# Altium footprint library Library.PcbLib: 225 footprints (part 13 of 16)
Each footprint in its own frame and in the unit in brackets; x right, y up, seen from the top. Pads: shape width x height; smd on the part's side, far side on the other; paste and mask are expansions set on the pad; w line width, h text height; cw(c..) or ccw(c..) is an arc to the next point about the centre after c.
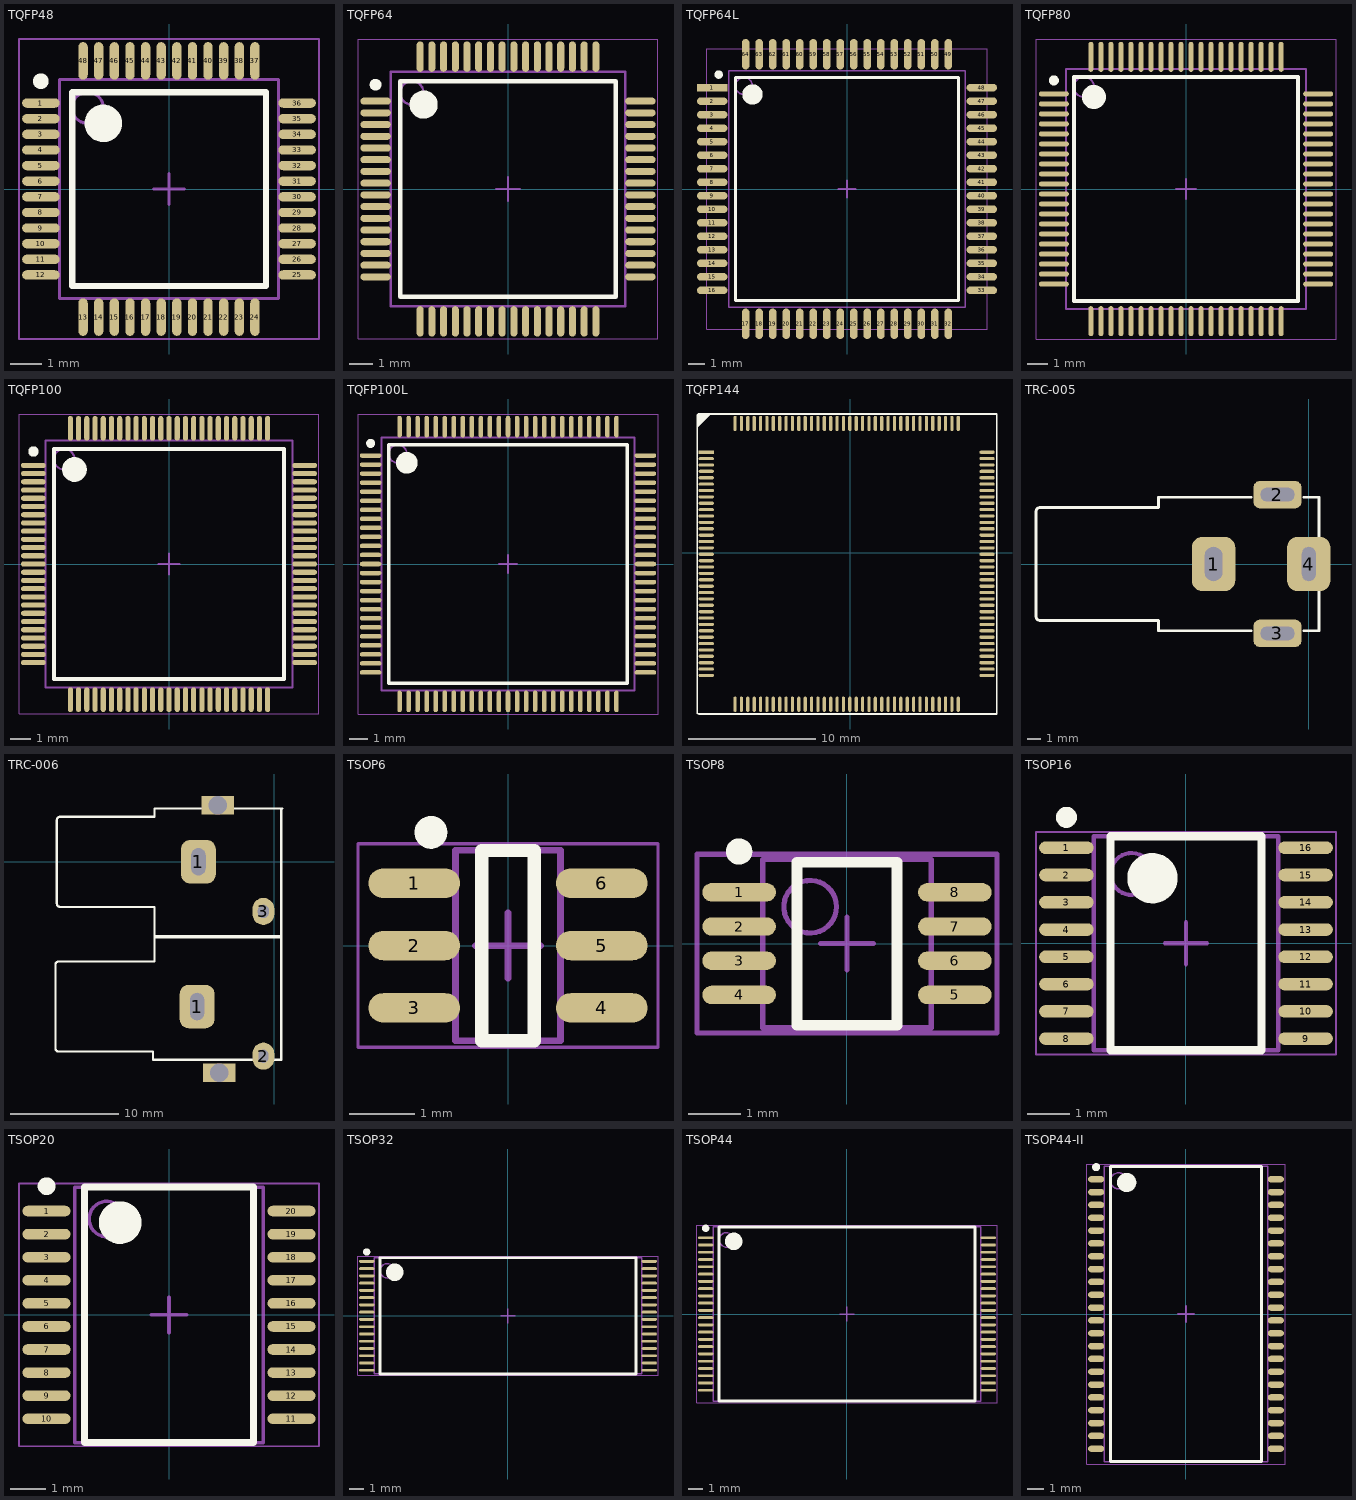
[diagram p12: the footprints below, top view; thin cyan lines are the x and y axes]

## TQFP48 [mm] "TQFP, 48-Leads, Body 7.00x7.00mm, Pitch 0.50mm, IPC High Density"
height 1.6
pads (48):
  oval 1.2x0.3 smd: 1(-4.1,2.75) 2(-4.1,2.25) 3(-4.1,1.75) 4(-4.1,1.25) 5(-4.1,0.75) 6(-4.1,0.25) 7(-4.1,-0.25) 8(-4.1,-0.75) 9(-4.1,-1.25) 10(-4.1,-1.75) 11(-4.1,-2.25) 12(-4.1,-2.75) 25(4.1,-2.75) 26(4.1,-2.25) 27(4.1,-1.75) 28(4.1,-1.25) 29(4.1,-0.75) 30(4.1,-0.25) 31(4.1,0.25) 32(4.1,0.75) 33(4.1,1.25) 34(4.1,1.75) 35(4.1,2.25) 36(4.1,2.75)
  oval 0.3x1.2 smd: 13(-2.75,-4.1) 14(-2.25,-4.1) 15(-1.75,-4.1) 16(-1.25,-4.1) 17(-0.75,-4.1) 18(-0.25,-4.1) 19(0.25,-4.1) 20(0.75,-4.1) 21(1.25,-4.1) 22(1.75,-4.1) 23(2.25,-4.1) 24(2.75,-4.1) 37(2.75,4.1) 38(2.25,4.1) 39(1.75,4.1) 40(1.25,4.1) 41(0.75,4.1) 42(0.25,4.1) 43(-0.25,4.1) 44(-0.75,4.1) 45(-1.25,4.1) 46(-1.75,4.1) 47(-2.25,4.1) 48(-2.75,4.1)
Top Overlay:
  circle w0.6: c-2.1,2.1 r0.3
  circle w0.25: c-4.1,3.45 r0.125
  lines w0.2: -3.1,-3.1 3.1,-3.1 3.1,3.1 -3.1,3.1 -3.1,-3.1
Mechanical 13:
  circle w0.1: c-2.6,2.6 r0.5
  lines w0.1: -3.5,-3.5 3.5,-3.5 3.5,3.5 -3.5,3.5 -3.5,-3.5
Mechanical 15:
  lines w0.05: -4.8,-4.8 4.8,-4.8 4.8,4.8 -4.8,4.8 -4.8,-4.8
  lines w0.1: -0.5,0 0.5,0 ; 0,-0.5 0,0.5
3D body "User Library-TQFP-48.STEP": height 1.45, standoff -0.01, extent -4.5,-4.5 4.5,4.5

## TQFP64 [mm] "TQFP, 64-Leads, Body 10.00x10.00mm, Pitch 0.50mm, IPC High Density"
height 1.3
pads (64):
  oval 1.3x0.3 smd: 1(-5.65,3.75) 2(-5.65,3.25) 3(-5.65,2.75) 4(-5.65,2.25) 5(-5.65,1.75) 6(-5.65,1.25) 7(-5.65,0.75) 8(-5.65,0.25) 9(-5.65,-0.25) 10(-5.65,-0.75) 11(-5.65,-1.25) 12(-5.65,-1.75) 13(-5.65,-2.25) 14(-5.65,-2.75) 15(-5.65,-3.25) 16(-5.65,-3.75) 33(5.65,-3.75) 34(5.65,-3.25) 35(5.65,-2.75) 36(5.65,-2.25) 37(5.65,-1.75) 38(5.65,-1.25) 39(5.65,-0.75) 40(5.65,-0.25) 41(5.65,0.25) 42(5.65,0.75) 43(5.65,1.25) 44(5.65,1.75) 45(5.65,2.25) 46(5.65,2.75) 47(5.65,3.25) 48(5.65,3.75)
  oval 0.3x1.3 smd: 17(-3.75,-5.65) 18(-3.25,-5.65) 19(-2.75,-5.65) 20(-2.25,-5.65) 21(-1.75,-5.65) 22(-1.25,-5.65) 23(-0.75,-5.65) 24(-0.25,-5.65) 25(0.25,-5.65) 26(0.75,-5.65) 27(1.25,-5.65) 28(1.75,-5.65) 29(2.25,-5.65) 30(2.75,-5.65) 31(3.25,-5.65) 32(3.75,-5.65) 49(3.75,5.65) 50(3.25,5.65) 51(2.75,5.65) 52(2.25,5.65) 53(1.75,5.65) 54(1.25,5.65) 55(0.75,5.65) 56(0.25,5.65) 57(-0.25,5.65) 58(-0.75,5.65) 59(-1.25,5.65) 60(-1.75,5.65) 61(-2.25,5.65) 62(-2.75,5.65) 63(-3.25,5.65) 64(-3.75,5.65)
Top Overlay:
  circle w0.25: c-5.65,4.45 r0.125
  circle w0.6: c-3.6,3.6 r0.3
  lines w0.2: -4.6,-4.6 -4.6,4.6 4.6,4.6 4.6,-4.6 -4.6,-4.6
Mechanical 13:
  circle w0.1: c-4.1,4.1 r0.5
  lines w0.1: -5,-5 -5,5 5,5 5,-5 -5,-5
Mechanical 15:
  lines w0.05: -6.4,-6.4 -6.4,6.4 6.4,6.4 6.4,-6.4 -6.4,-6.4
  lines w0.1: -0.5,0 0.5,0 ; 0,-0.5 0,0.5
3D body "User Library-S-PQFP-G64.step": height 1, standoff 0, extent -5.787,-5.79 5.787,5.791

## TQFP64L [mm] "TQFP, 64-Leads, Body 14.00x14.00mm, Pitch 0.80mm, IPC High Density"
height 1.4
pads (64):
  rect 1.8x0.45 smd: 1(-7.981,6)
  oval 1.8x0.45 smd: 2(-7.981,5.2) 3(-7.981,4.4) 4(-7.981,3.6) 5(-7.981,2.8) 6(-7.981,2) 7(-7.981,1.2) 8(-7.981,0.4) 9(-7.981,-0.4) 10(-7.981,-1.2) 11(-7.981,-2) 12(-7.981,-2.8) 13(-7.981,-3.6) 14(-7.981,-4.4) 15(-7.981,-5.2) 16(-7.981,-6) 33(7.981,-6) 34(7.981,-5.2) 35(7.981,-4.4) 36(7.981,-3.6) 37(7.981,-2.8) 38(7.981,-2) 39(7.981,-1.2) 40(7.981,-0.4) 41(7.981,0.4) 42(7.981,1.2) 43(7.981,2) 44(7.981,2.8) 45(7.981,3.6) 46(7.981,4.4) 47(7.981,5.2) 48(7.981,6)
  oval 0.45x1.8 smd: 17(-6,-7.981) 18(-5.2,-7.981) 19(-4.4,-7.981) 20(-3.6,-7.981) 21(-2.8,-7.981) 22(-2,-7.981) 23(-1.2,-7.981) 24(-0.4,-7.981) 25(0.4,-7.981) 26(1.2,-7.981) 27(2,-7.981) 28(2.8,-7.981) 29(3.6,-7.981) 30(4.4,-7.981) 31(5.2,-7.981) 32(6,-7.981) 49(6,7.981) 50(5.2,7.981) 51(4.4,7.981) 52(3.6,7.981) 53(2.8,7.981) 54(2,7.981) 55(1.2,7.981) 56(0.4,7.981) 57(-0.4,7.981) 58(-1.2,7.981) 59(-2,7.981) 60(-2.8,7.981) 61(-3.6,7.981) 62(-4.4,7.981) 63(-5.2,7.981) 64(-6,7.981)
Top Overlay:
  circle w0.6: c-5.6,5.6 r0.3
  circle w0.25: c-7.6,6.775 r0.125
  lines w0.2: -6.604,-6.604 6.596,-6.604 ; -6.6,-6.6 -6.6,6.6 6.6,6.6 6.6,-6.6
Mechanical 13:
  circle w0.1: c-6.1,6.1 r0.5
  lines w0.1: -7,-7 7,-7 7,7 -7,7 -7,-7
Mechanical 15:
  lines w0.05: -8.3,-8.3 8.3,-8.3 8.3,8.3 -8.3,8.3 -8.3,-8.3
  lines w0.1: -0.5,0 0.5,0 ; 0,-0.5 0,0.5
3D body "User Library-atmega64 (tqfp64).step": height 1.1, standoff -0.01, extent -7.968,-7.968 8.032,8.032

## TQFP80 [mm] "TQFP, 80-Leads, Body 12.00x12.00mm, Pitch 0.50mm, IPC High Density"
height 1
pads (80):
  oval 1.5x0.25 smd: 1(-6.6,4.75) 2(-6.6,4.25) 3(-6.6,3.75) 4(-6.6,3.25) 5(-6.6,2.75) 6(-6.6,2.25) 7(-6.6,1.75) 8(-6.6,1.25) 9(-6.6,0.75) 10(-6.6,0.25) 11(-6.6,-0.25) 12(-6.6,-0.75) 13(-6.6,-1.25) 14(-6.6,-1.75) 15(-6.6,-2.25) 16(-6.6,-2.75) 17(-6.6,-3.25) 18(-6.6,-3.75) 19(-6.6,-4.25) 20(-6.6,-4.75) 41(6.6,-4.75) 42(6.6,-4.25) 43(6.6,-3.75) 44(6.6,-3.25) 45(6.6,-2.75) 46(6.6,-2.25) 47(6.6,-1.75) 48(6.6,-1.25) 49(6.6,-0.75) 50(6.6,-0.25) 51(6.6,0.25) 52(6.6,0.75) 53(6.6,1.25) 54(6.6,1.75) 55(6.6,2.25) 56(6.6,2.75) 57(6.6,3.25) 58(6.6,3.75) 59(6.6,4.25) 60(6.6,4.75)
  oval 0.25x1.5 smd: 21(-4.75,-6.6) 22(-4.25,-6.6) 23(-3.75,-6.6) 24(-3.25,-6.6) 25(-2.75,-6.6) 26(-2.25,-6.6) 27(-1.75,-6.6) 28(-1.25,-6.6) 29(-0.75,-6.6) 30(-0.25,-6.6) 31(0.25,-6.6) 32(0.75,-6.6) 33(1.25,-6.6) 34(1.75,-6.6) 35(2.25,-6.6) 36(2.75,-6.6) 37(3.25,-6.6) 38(3.75,-6.6) 39(4.25,-6.6) 40(4.75,-6.6) 61(4.75,6.6) 62(4.25,6.6) 63(3.75,6.6) 64(3.25,6.6) 65(2.75,6.6) 66(2.25,6.6) 67(1.75,6.6) 68(1.25,6.6) 69(0.75,6.6) 70(0.25,6.6) 71(-0.25,6.6) 72(-0.75,6.6) 73(-1.25,6.6) 74(-1.75,6.6) 75(-2.25,6.6) 76(-2.75,6.6) 77(-3.25,6.6) 78(-3.75,6.6) 79(-4.25,6.6) 80(-4.75,6.6)
Top Overlay:
  circle w0.6: c-4.6,4.6 r0.3
  circle w0.25: c-6.6,5.425 r0.125
  lines w0.2: -5.6,-5.6 5.6,-5.6 5.6,5.6 -5.6,5.6 -5.6,-5.6
Mechanical 13:
  circle w0.1: c-5.1,5.1 r0.5
  lines w0.1: -6,-6 6,-6 6,6 -6,6 -6,-6
Mechanical 15:
  lines w0.05: -7.493,-7.493 7.493,-7.493 7.493,7.493 -7.493,7.493 -7.493,-7.493
  lines w0.1: -0.5,0 0.5,0 ; 0,-0.5 0,0.5
3D body "User Library-TQFP-80.STEP": height 1.05, standoff -0.01, extent -7,-7 7,7

## TQFP100 [mm] "TQFP, 100-Leads, Body 12.00x12.00mm, Pitch 0.40mm, IPC High Density"
height 1
pads (100):
  oval 1.2x0.25 smd: 1(-6.6,4.8) 2(-6.6,4.4) 3(-6.6,4) 4(-6.6,3.6) 5(-6.6,3.2) 6(-6.6,2.8) 7(-6.6,2.4) 8(-6.6,2) 9(-6.6,1.6) 10(-6.6,1.2) 11(-6.6,0.8) 12(-6.6,0.4) 13(-6.6,0) 14(-6.6,-0.4) 15(-6.6,-0.8) 16(-6.6,-1.2) 17(-6.6,-1.6) 18(-6.6,-2) 19(-6.6,-2.4) 20(-6.6,-2.8) 21(-6.6,-3.2) 22(-6.6,-3.6) 23(-6.6,-4) 24(-6.6,-4.4) 25(-6.6,-4.8) 51(6.6,-4.8) 52(6.6,-4.4) 53(6.6,-4) 54(6.6,-3.6) 55(6.6,-3.2) 56(6.6,-2.8) 57(6.6,-2.4) 58(6.6,-2) 59(6.6,-1.6) 60(6.6,-1.2) 61(6.6,-0.8) 62(6.6,-0.4) 63(6.6,0) 64(6.6,0.4) 65(6.6,0.8) 66(6.6,1.2) 67(6.6,1.6) 68(6.6,2) 69(6.6,2.4) 70(6.6,2.8) 71(6.6,3.2) 72(6.6,3.6) 73(6.6,4) 74(6.6,4.4) 75(6.6,4.8)
  oval 0.25x1.2 smd: 26(-4.8,-6.6) 27(-4.4,-6.6) 28(-4,-6.6) 29(-3.6,-6.6) 30(-3.2,-6.6) 31(-2.8,-6.6) 32(-2.4,-6.6) 33(-2,-6.6) 34(-1.6,-6.6) 35(-1.2,-6.6) 36(-0.8,-6.6) 37(-0.4,-6.6) 38(0,-6.6) 39(0.4,-6.6) 40(0.8,-6.6) 41(1.2,-6.6) 42(1.6,-6.6) 43(2,-6.6) 44(2.4,-6.6) 45(2.8,-6.6) 46(3.2,-6.6) 47(3.6,-6.6) 48(4,-6.6) 49(4.4,-6.6) 50(4.8,-6.6) 76(4.8,6.6) 77(4.4,6.6) 78(4,6.6) 79(3.6,6.6) 80(3.2,6.6) 81(2.8,6.6) 82(2.4,6.6) 83(2,6.6) 84(1.6,6.6) 85(1.2,6.6) 86(0.8,6.6) 87(0.4,6.6) 88(0,6.6) 89(-0.4,6.6) 90(-0.8,6.6) 91(-1.2,6.6) 92(-1.6,6.6) 93(-2,6.6) 94(-2.4,6.6) 95(-2.8,6.6) 96(-3.2,6.6) 97(-3.6,6.6) 98(-4,6.6) 99(-4.4,6.6) 100(-4.8,6.6)
Top Overlay:
  circle w0.25: c-6.6,5.475 r0.125
  circle w0.6: c-4.6,4.6 r0.3
  lines w0.2: -5.6,-5.6 -5.6,5.6 5.6,5.6 5.6,-5.6 -5.6,-5.6
Mechanical 13:
  circle w0.1: c-5.1,5.1 r0.5
  lines w0.1: -6,-6 -6,6 6,6 6,-6 -6,-6
Mechanical 15:
  lines w0.05: -7.3,-7.3 -7.3,7.3 7.3,7.3 7.3,-7.3 -7.3,-7.3
  lines w0.1: -0.5,0 0.5,0 ; 0,-0.5 0,0.5
3D body "User Library-TQFP100_0_4mm.step": height 1.2, standoff 0, extent -7,-6.985 7,7.015

## TQFP100L [mm] "TQFP, 100-Leads, Body 14.00x14.00mm, Pitch 0.50mm, IPC High Density"
height 2
pads (100):
  oval 1.2x0.25 smd: 1(-7.6,6) 2(-7.6,5.5) 3(-7.6,5) 4(-7.6,4.5) 5(-7.6,4) 6(-7.6,3.5) 7(-7.6,3) 8(-7.6,2.5) 9(-7.6,2) 10(-7.6,1.5) 11(-7.6,1) 12(-7.6,0.5) 13(-7.6,0) 14(-7.6,-0.5) 15(-7.6,-1) 16(-7.6,-1.5) 17(-7.6,-2) 18(-7.6,-2.5) 19(-7.6,-3) 20(-7.6,-3.5) 21(-7.6,-4) 22(-7.6,-4.5) 23(-7.6,-5) 24(-7.6,-5.5) 25(-7.6,-6) 51(7.6,-6) 52(7.6,-5.5) 53(7.6,-5) 54(7.6,-4.5) 55(7.6,-4) 56(7.6,-3.5) 57(7.6,-3) 58(7.6,-2.5) 59(7.6,-2) 60(7.6,-1.5) 61(7.6,-1) 62(7.6,-0.5) 63(7.6,0) 64(7.6,0.5) 65(7.6,1) 66(7.6,1.5) 67(7.6,2) 68(7.6,2.5) 69(7.6,3) 70(7.6,3.5) 71(7.6,4) 72(7.6,4.5) 73(7.6,5) 74(7.6,5.5) 75(7.6,6)
  oval 0.25x1.2 smd: 26(-6,-7.6) 27(-5.5,-7.6) 28(-5,-7.6) 29(-4.5,-7.6) 30(-4,-7.6) 31(-3.5,-7.6) 32(-3,-7.6) 33(-2.5,-7.6) 34(-2,-7.6) 35(-1.5,-7.6) 36(-1,-7.6) 37(-0.5,-7.6) 38(0,-7.6) 39(0.5,-7.6) 40(1,-7.6) 41(1.5,-7.6) 42(2,-7.6) 43(2.5,-7.6) 44(3,-7.6) 45(3.5,-7.6) 46(4,-7.6) 47(4.5,-7.6) 48(5,-7.6) 49(5.5,-7.6) 50(6,-7.6) 76(6,7.6) 77(5.5,7.6) 78(5,7.6) 79(4.5,7.6) 80(4,7.6) 81(3.5,7.6) 82(3,7.6) 83(2.5,7.6) 84(2,7.6) 85(1.5,7.6) 86(1,7.6) 87(0.5,7.6) 88(0,7.6) 89(-0.5,7.6) 90(-1,7.6) 91(-1.5,7.6) 92(-2,7.6) 93(-2.5,7.6) 94(-3,7.6) 95(-3.5,7.6) 96(-4,7.6) 97(-4.5,7.6) 98(-5,7.6) 99(-5.5,7.6) 100(-6,7.6)
Top Overlay:
  circle w0.25: c-7.6,6.675 r0.125
  circle w0.6: c-5.6,5.6 r0.3
  lines w0.2: -6.6,-6.6 -6.6,6.6 6.6,6.6 6.6,-6.6 -6.6,-6.6
Mechanical 13:
  circle w0.1: c-6.1,6.1 r0.5
  lines w0.1: -7,-7 -7,7 7,7 7,-7 -7,-7
Mechanical 15:
  lines w0.05: -8.3,-8.3 -8.3,8.3 8.3,8.3 8.3,-8.3 -8.3,-8.3
  lines w0.1: -0.5,0 0.5,0 ; 0,-0.5 0,0.5
3D body "User Library-TQFP100_Grid_0_5.STEP": height 1.2, standoff 0, extent -8,-8 8,8

## TQFP144 [mm]
pads (144):
  rect 1.2x0.254 smd: 1(-11.303,7.874)
  oval 1.2x0.254 smd: 2(-11.303,7.374) 3(-11.303,6.874) 4(-11.303,6.374) 5(-11.303,5.874) 6(-11.303,5.374) 7(-11.303,4.874) 8(-11.303,4.374) 9(-11.303,3.874) 10(-11.303,3.374) 11(-11.303,2.874) 12(-11.303,2.374) 13(-11.303,1.874) 14(-11.303,1.374) 15(-11.303,0.874) 16(-11.303,0.374) 17(-11.303,-0.126) 18(-11.303,-0.626) 19(-11.303,-1.126) 20(-11.303,-1.626) 21(-11.303,-2.126) 22(-11.303,-2.626) 23(-11.303,-3.126) 24(-11.303,-3.626) 25(-11.303,-4.126) 26(-11.303,-4.626) 27(-11.303,-5.126) 28(-11.303,-5.626) 29(-11.303,-6.126) 30(-11.303,-6.626) 31(-11.303,-7.126) 32(-11.303,-7.626) 33(-11.303,-8.126) 34(-11.303,-8.626) 35(-11.303,-9.126) 36(-11.303,-9.626) 73(10.713,-9.626) 74(10.713,-9.126) 75(10.713,-8.626) 76(10.713,-8.126) 77(10.713,-7.626) 78(10.713,-7.126) 79(10.713,-6.626) 80(10.713,-6.126) 81(10.713,-5.626) 82(10.713,-5.126) 83(10.713,-4.626) 84(10.713,-4.126) 85(10.713,-3.626) 86(10.713,-3.126) 87(10.713,-2.626) 88(10.713,-2.126) 89(10.713,-1.626) 90(10.713,-1.126) 91(10.713,-0.626) 92(10.713,-0.126) 93(10.713,0.374) 94(10.713,0.874) 95(10.713,1.374) 96(10.713,1.874) 97(10.713,2.374) 98(10.713,2.874) 99(10.713,3.374) 100(10.713,3.874) 101(10.713,4.374) 102(10.713,4.874) 103(10.713,5.374) 104(10.713,5.874) 105(10.713,6.374) 106(10.713,6.874) 107(10.713,7.374) 108(10.713,7.874)
  oval 0.254x1.2 smd: 37(-9.045,-11.884) 38(-8.545,-11.884) 39(-8.045,-11.884) 40(-7.545,-11.884) 41(-7.045,-11.884) 42(-6.545,-11.884) 43(-6.045,-11.884) 44(-5.545,-11.884) 45(-5.045,-11.884) 46(-4.545,-11.884) 47(-4.045,-11.884) 48(-3.545,-11.884) 49(-3.045,-11.884) 50(-2.545,-11.884) 51(-2.045,-11.884) 52(-1.545,-11.884) 53(-1.045,-11.884) 54(-0.545,-11.884) 55(-0.045,-11.884) 56(0.455,-11.884) 57(0.955,-11.884) 58(1.455,-11.884) 59(1.955,-11.884) 60(2.455,-11.884) 61(2.955,-11.884) 62(3.455,-11.884) 63(3.955,-11.884) 64(4.455,-11.884) 65(4.955,-11.884) 66(5.455,-11.884) 67(5.955,-11.884) 68(6.455,-11.884) 69(6.955,-11.884) 70(7.455,-11.884) 71(7.955,-11.884) 72(8.455,-11.884) 109(8.455,10.132) 110(7.955,10.132) 111(7.455,10.132) 112(6.955,10.132) 113(6.455,10.132) 114(5.955,10.132) 115(5.455,10.132) 116(4.955,10.132) 117(4.455,10.132) 118(3.955,10.132) 119(3.455,10.132) 120(2.955,10.132) 121(2.455,10.132) 122(1.955,10.132) 123(1.455,10.132) 124(0.955,10.132) 125(0.455,10.132) 126(-0.045,10.132) 127(-0.545,10.132) 128(-1.045,10.132) 129(-1.545,10.132) 130(-2.045,10.132) 131(-2.545,10.132) 132(-3.045,10.132) 133(-3.545,10.132) 134(-4.045,10.132) 135(-4.545,10.132) 136(-5.045,10.132) 137(-5.545,10.132) 138(-6.045,10.132) 139(-6.545,10.132) 140(-7.045,10.132) 141(-7.545,10.132) 142(-8.045,10.132) 143(-8.545,10.132) 144(-9.045,10.132)
Top Overlay:
  lines w0.127: -11.306,10.792 -11.941,10.157 ; -11.125,10.871 -11.938,10.871 -12.017,10.792 ; -12.017,10.792 -12.017,10.614 -11.839,10.792 ; -12.017,10.792 -12.017,-12.595 -11.887,-12.649 11.481,-12.649 11.481,10.871 -11.862,10.871 -12.017,10.792 ; -12.017,10.792 -11.687,10.792 ; -11.941,10.157 -11.941,10.69 ; -11.941,10.157 -11.941,10.69 ; -11.941,10.157 -11.941,10.284 -11.433,10.792 ; -11.941,10.69 -11.839,10.792 ; -11.941,10.69 -11.839,10.792 ; -11.839,10.792 -11.687,10.792 ; -11.839,10.792 -11.207,10.792 -12.017,9.982 -12.017,9.852 -11.077,10.792 -11.433,10.792 ; -11.839,10.792 -11.433,10.792 ; -11.687,10.792 -11.941,10.538 -11.941,10.411 -11.56,10.792 -11.433,10.792
3D body "User Library-DSP_144 PIN TQFP.step": height 1.64, standoff -0.01, extent -11.303,-11.889 10.697,10.111

## TRC-005 [mm] "RCA Phono Jack, Right Angle, Thru-Hole, Body 20.8 x 9.8 x 11 mm (LxWxH)"
height 11
pads (4):
  rrect50% 3.2x4 hole 1.3 slot 2.5 at 90 deg mask+0: 1(-7,0)
  rrect50% 3.556x2.032 hole 1 slot 2.5 at 0 deg: 2(-2.3,5.1) 3(-2.3,-5.1)
  rrect50% 3.2x4 hole 1 slot 2.5 at 90 deg: 4(0,0)
Top Overlay:
  lines w0.2: -4.235,-4.9 -11.05,-4.9 -11.05,-4.15 -19.75,-4.15 cw(c-19.75,-3.85) -20.05,-3.85 -20.05,3.85 cw(c-19.75,3.85) -19.75,4.15 -11.05,4.15 -11.05,4.9 -4.235,4.9 ; -0.365,-4.9 0.75,-4.9 0.75,-1.69 ; -0.365,4.9 0.75,4.9 0.75,1.69
Mechanical 2:
  lines w1: -3.104,5.1 -1.604,5.1 ; -3.05,-5.1 -1.55,-5.1 ; 0,-0.75 0,0.75
  lines w1.3: -7,-0.6 -7,0.6
Mechanical 7:
  text "Mech 1 - Slot cut-out" at -11.026,6.743 h0.3
  text "Mech 2 - Clearance, move to internal plane if present" at -11.026,6.243 h0.3
  text "Alert PCB fab to slot details" at -11.026,7.143 h0.3
  text "Assign keep-out area to slot" at -11.026,7.643 h0.3
3D body: height 3, standoff 0, extent -7.067,2.451 -5.517,4.001
3D body "RCA Phono Jack.stp": height 13.58, standoff -4.84, extent -20.019,-5.265 0.483,5.519

## TRC-006 [mm]
height 11
pads (6):
  rrect50% 3.2x4 hole 1.3 slot 2.5 at 90 deg mask+0: 1(-7.127,-13.335) 1(-7,0)
  oval 2x2.5 hole 0.9 slot 1.2 at 90 deg: 2(-1.016,-17.907)
  oval 2x2.5 hole 1 slot 1.2 at 90 deg: 3(-1.016,-4.572)
  rect 3x1.7 hole 1.7 square unplated: ""(-5.207,5.207) ""(-5.08,-19.431)
Top Overlay:
  lines w0.2: -0.492,-18.235 0.623,-18.235 0.623,-15.025 ; 0.254,-18.235 -4.362,-18.235 -11.177,-18.235 -11.177,-17.485 -19.877,-17.485 cw(c-19.877,-17.185) -20.177,-17.185 -20.177,-9.485 cw(c-19.877,-9.485) -19.877,-9.185 -11.049,-9.185 -11.049,-6.985 -4.362,-6.985 0.623,-6.985 0.623,-7.354 0.623,-1.69 0.635,-1.69 0.635,4.9 0.75,4.9 -0.365,4.9 -4.235,4.9 -11.05,4.9 -11.05,4.15 -19.75,4.15 ccw(c-19.75,3.85) -20.05,3.85 -20.05,-3.85 ccw(c-19.75,-3.85) -19.75,-4.15 -11.05,-4.15 -11.05,-6.858 -6.193,-6.858 0.127,-6.858 0.623,-6.858 0.623,-8.435 0.623,-11.645 0.623,-15.24
Mechanical 2:
  lines w1.3: -7.127,-13.935 -7.127,-12.735 ; -7,-0.6 -7,0.6
Mechanical 7:
  text "Mech 1 - Slot cut-out" at -11.153,-6.846 h0.3
  text "Mech 2 - Clearance, move to internal plane if present" at -11.153,-7.092 h0.3
  text "Alert PCB fab to slot details" at -11.153,-6.7 h0.3
  text "Assign keep-out area to slot" at -11.026,7.643 h0.3
  text "Alert PCB fab to slot details" at -11.026,7.143 h0.3
  text "Mech 2 - Clearance, move to internal plane if present" at -11.026,6.243 h0.3
  text "Mech 1 - Slot cut-out" at -11.026,6.743 h0.3
3D body "User Library-RCA-1.step": height 20.52, standoff -2.63, extent -18.502,-20.45 -0.802,6.35

## TSOP6 [mm] "TSOP, 6-Leads, Body 2.90x1.63mm, Pitch 0.95mm, IPC High Density"
height 1
pads (6):
  oval 1.4x0.45 smd: 1(-1.429,0.95) 2(-1.429,0) 3(-1.429,-0.95) 4(1.429,-0.95) 5(1.429,0) 6(1.429,0.95)
Top Overlay:
  circle w0.25: c-1.175,1.725 r0.125
  lines w0.2: -0.4,-1.45 0.4,-1.45 0.4,1.45 -0.4,1.45 -0.4,-1.45
Mechanical 13:
  lines w0.1: -0.8,-1.45 0.8,-1.45 0.8,1.45 -0.8,1.45 -0.8,-1.45
Mechanical 15:
  lines w0.05: -2.286,-1.55 2.286,-1.55 2.286,1.55 -2.286,1.55 -2.286,-1.55
  lines w0.1: -0.5,0 0.5,0 ; 0,-0.5 0,0.5
3D body "User Library-TSOP6.step": height 1.04, standoff -0.01, extent -1.375,-1.5 1.375,1.5

## TSOP8 [mm] "TSOP, 8-Leads, Body 3x3mm, Pitch 0.65mm, IPC High Density"
height 1.1
pads (8):
  oval 1.4x0.35 smd: 1(-2.05,0.975) 2(-2.05,0.325) 3(-2.05,-0.325) 4(-2.05,-0.975) 5(2.05,-0.975) 6(2.05,-0.325) 7(2.05,0.325) 8(2.05,0.975)
Top Overlay:
  circle w0.25: c-2.05,1.75 r0.125
  lines w0.2: -0.95,-1.55 -0.95,1.55 0.95,1.55 0.95,-1.55 -0.95,-1.55
Mechanical 13:
  circle w0.1: c-0.7,0.7 r0.5
  lines w0.1: -1.6,-1.6 -1.6,1.6 1.6,1.6 1.6,-1.6 -1.6,-1.6
Mechanical 15:
  lines w0.1: -0.5,0 0.5,0 ; 0,-0.5 0,0.5 ; -2.85,-1.7 -2.85,1.7 2.85,1.7 2.85,-1.7 -2.85,-1.7
3D body "TSOP65P470X150-8N.step": height 1.5, standoff 0, extent -2.35,-1.5 2.35,1.5

## TSOP16 [mm] "TSOP, 16-Leads, Body 5.10x4.40mm, Pitch 0.65mm, IPC High Density"
height 1
pads (16):
  oval 1.3x0.3 smd: 1(-2.85,2.275) 2(-2.85,1.625) 3(-2.85,0.975) 4(-2.85,0.325) 5(-2.85,-0.325) 6(-2.85,-0.975) 7(-2.85,-1.625) 8(-2.85,-2.275) 9(2.85,-2.275) 10(2.85,-1.625) 11(2.85,-0.975) 12(2.85,-0.325) 13(2.85,0.325) 14(2.85,0.975) 15(2.85,1.625) 16(2.85,2.275)
Top Overlay:
  circle w0.6: c-0.8,1.55 r0.3
  circle w0.25: c-2.85,3 r0.125
  lines w0.2: -1.8,-2.55 1.8,-2.55 1.8,2.55 -1.8,2.55 -1.8,-2.55
Mechanical 13:
  circle w0.1: c-1.3,1.65 r0.5
  lines w0.1: -2.2,-2.55 2.2,-2.55 2.2,2.55 -2.2,2.55 -2.2,-2.55
Mechanical 15:
  lines w0.05: -3.575,-2.65 3.575,-2.65 3.575,2.65 -3.575,2.65 -3.575,-2.65
  lines w0.1: -0.5,0 0.5,0 ; 0,-0.5 0,0.5
3D body "TSOP65P640X150-16N.step": height 1.5, standoff 0, extent -3.19,-2.6 3.19,2.6

## TSOP20 [mm] "TSOP, 20-Leads, Body 7.20x5.30mm, Pitch 0.65mm, IPC High Density"
height 1
pads (20):
  oval 1.35x0.3 smd: 1(-3.45,2.925) 2(-3.45,2.275) 3(-3.45,1.625) 4(-3.45,0.975) 5(-3.45,0.325) 6(-3.45,-0.325) 7(-3.45,-0.975) 8(-3.45,-1.625) 9(-3.45,-2.275) 10(-3.45,-2.925) 11(3.45,-2.925) 12(3.45,-2.275) 13(3.45,-1.625) 14(3.45,-0.975) 15(3.45,-0.325) 16(3.45,0.325) 17(3.45,0.975) 18(3.45,1.625) 19(3.45,2.275) 20(3.45,2.925)
Top Overlay:
  circle w0.25: c-3.45,3.625 r0.125
  circle w0.6: c-1.375,2.6 r0.3
  lines w0.2: -2.375,-3.6 -2.375,3.6 2.375,3.6 2.375,-3.6 -2.375,-3.6
Mechanical 13:
  circle w0.1: c-1.75,2.7 r0.5
  lines w0.1: -2.65,-3.6 -2.65,3.6 2.65,3.6 2.65,-3.6 -2.65,-3.6
Mechanical 15:
  lines w0.05: -4.225,-3.7 -4.225,3.7 4.225,3.7 4.225,-3.7 -4.225,-3.7
  lines w0.1: -0.5,0 0.5,0 ; 0,-0.5 0,0.5
3D body "TSOP65P770X150-20N.step": height 1.5, standoff 0, extent -3.85,-3.6 3.85,3.6

## TSOP32 [mm] "TSOP, 32-Leads, Body 8.00x18.40mm, Pitch 0.50mm, IPC High Density"
height 1.1
pads (32):
  oval 1.05x0.2 smd: 1(-9.725,3.75) 2(-9.725,3.25) 3(-9.725,2.75) 4(-9.725,2.25) 5(-9.725,1.75) 6(-9.725,1.25) 7(-9.725,0.75) 8(-9.725,0.25) 9(-9.725,-0.25) 10(-9.725,-0.75) 11(-9.725,-1.25) 12(-9.725,-1.75) 13(-9.725,-2.25) 14(-9.725,-2.75) 15(-9.725,-3.25) 16(-9.725,-3.75) 17(9.725,-3.75) 18(9.725,-3.25) 19(9.725,-2.75) 20(9.725,-2.25) 21(9.725,-1.75) 22(9.725,-1.25) 23(9.725,-0.75) 24(9.725,-0.25) 25(9.725,0.25) 26(9.725,0.75) 27(9.725,1.25) 28(9.725,1.75) 29(9.725,2.25) 30(9.725,2.75) 31(9.725,3.25) 32(9.725,3.75)
Top Overlay:
  circle w0.25: c-9.725,4.4 r0.125
  circle w0.6: c-7.8,3 r0.3
  lines w0.2: -8.8,-4 -8.8,4 8.8,4 8.8,-4 -8.8,-4
Mechanical 13:
  circle w0.1: c-8.3,3.1 r0.5
  lines w0.1: -9.2,-4 -9.2,4 9.2,4 9.2,-4 -9.2,-4
Mechanical 15:
  lines w0.05: -10.325,-4.1 -10.325,4.1 10.325,4.1 10.325,-4.1 -10.325,-4.1
  lines w0.1: -0.5,0 0.5,0 ; 0,-0.5 0,0.5
3D body "TSSOP50P2000X150-32N.step": height 1.5, standoff 0, extent -10,-4 10,4

## TSOP44 [mm] "TSOP, 44-Leads, Body 12.00x18.40mm, Pitch 0.50mm, IPC High Density"
height 1.2
pads (44):
  oval 1.05x0.2 smd: 1(-9.725,5.25) 2(-9.725,4.75) 3(-9.725,4.25) 4(-9.725,3.75) 5(-9.725,3.25) 6(-9.725,2.75) 7(-9.725,2.25) 8(-9.725,1.75) 9(-9.725,1.25) 10(-9.725,0.75) 11(-9.725,0.25) 12(-9.725,-0.25) 13(-9.725,-0.75) 14(-9.725,-1.25) 15(-9.725,-1.75) 16(-9.725,-2.25) 17(-9.725,-2.75) 18(-9.725,-3.25) 19(-9.725,-3.75) 20(-9.725,-4.25) 21(-9.725,-4.75) 22(-9.725,-5.25) 23(9.725,-5.25) 24(9.725,-4.75) 25(9.725,-4.25) 26(9.725,-3.75) 27(9.725,-3.25) 28(9.725,-2.75) 29(9.725,-2.25) 30(9.725,-1.75) 31(9.725,-1.25) 32(9.725,-0.75) 33(9.725,-0.25) 34(9.725,0.25) 35(9.725,0.75) 36(9.725,1.25) 37(9.725,1.75) 38(9.725,2.25) 39(9.725,2.75) 40(9.725,3.25) 41(9.725,3.75) 42(9.725,4.25) 43(9.725,4.75) 44(9.725,5.25)
Top Overlay:
  circle w0.6: c-7.8,5 r0.3
  circle w0.25: c-9.725,5.9 r0.125
  lines w0.2: -8.8,-6 8.8,-6 8.8,6 -8.8,6 -8.8,-6
Mechanical 13:
  circle w0.1: c-8.3,5.1 r0.5
  lines w0.1: -9.2,-6 9.2,-6 9.2,6 -9.2,6 -9.2,-6
Mechanical 15:
  lines w0.05: -10.325,-6.1 10.325,-6.1 10.325,6.1 -10.325,6.1 -10.325,-6.1
  lines w0.1: -0.5,0 0.5,0 ; 0,-0.5 0,0.5
3D body "TSSOP50P2000X150-44N.step": height 1.5, standoff 0, extent -10,-6 10,6

## TSOP44-II [mm] "TSOP-II, 44-Leads, Body 18.41x10.16mm, Pitch 0.80mm, IPC High Density"
height 1.2
pads (44):
  oval 1x0.4 smd: 1(-5.6,8.4) 2(-5.6,7.6) 3(-5.6,6.8) 4(-5.6,6) 5(-5.6,5.2) 6(-5.6,4.4) 7(-5.6,3.6) 8(-5.6,2.8) 9(-5.6,2) 10(-5.6,1.2) 11(-5.6,0.4) 12(-5.6,-0.4) 13(-5.6,-1.2) 14(-5.6,-2) 15(-5.6,-2.8) 16(-5.6,-3.6) 17(-5.6,-4.4) 18(-5.6,-5.2) 19(-5.6,-6) 20(-5.6,-6.8) 21(-5.6,-7.6) 22(-5.6,-8.4) 23(5.6,-8.4) 24(5.6,-7.6) 25(5.6,-6.8) 26(5.6,-6) 27(5.6,-5.2) 28(5.6,-4.4) 29(5.6,-3.6) 30(5.6,-2.8) 31(5.6,-2) 32(5.6,-1.2) 33(5.6,-0.4) 34(5.6,0.4) 35(5.6,1.2) 36(5.6,2) 37(5.6,2.8) 38(5.6,3.6) 39(5.6,4.4) 40(5.6,5.2) 41(5.6,6) 42(5.6,6.8) 43(5.6,7.6) 44(5.6,8.4)
Top Overlay:
  circle w0.25: c-5.6,9.15 r0.125
  circle w0.6: c-3.7,8.2 r0.3
  lines w0.2: -4.7,-9.2 -4.7,9.2 4.7,9.2 4.7,-9.2 -4.7,-9.2
Mechanical 13:
  circle w0.1: c-4.2,8.3 r0.5
  lines w0.1: -5.1,-9.2 -5.1,9.2 5.1,9.2 5.1,-9.2 -5.1,-9.2
Mechanical 15:
  lines w0.05: -6.2,-9.35 -6.2,9.35 6.2,9.35 6.2,-9.35 -6.2,-9.35
  lines w0.1: -0.5,0 0.5,0 ; 0,-0.5 0,0.5
3D body "User Library-IPC SO (1).step": height 1.35, standoff 0, extent -5.908,-9.27 5.908,9.27